# Altium footprint library ICs And Semiconductors THD.PcbLib: 507 footprints (part 18 of 32) (continued)
## LED_DIALIGHT_571-0122-100F [mm] "2x 2mm LED (Top: Green, Bot: Green) PCB Edge Mounting (With positioning pins) DIALIGHT 571 Serie"
height 8.6
pads (4):
  round 1.7 hole 1: 1(0,0) 2(2.54,0) 3(5.08,0) 4(7.62,0)
Top Overlay:
  lines w0.2: -5.029,-0.902 -5.652,-0.902 cw(c-5.652,0) -5.652,0.902 -5.029,0.902 ; -4.826,-1.191 -5.029,-1.191 -5.029,1.196 -4.826,1.196 ; -4.445,0 -4.064,0 ; -4.064,-0.508 -4.064,0.508 ; -3.556,0 -3.175,0 ; -2.794,0 -2.413,0 ; -2.413,-0.508 -2.413,0.508 ; -1.905,0 -1.524,0 ; -1.67,-1.245 -1.67,-2.22 ccw(c-1.37,-2.22) -1.37,-2.52 -1.17,-2.52 ccw(c-1.17,-2.22) -1.15,-2.519 ; -0.87,-1.788 -0.87,-1.245 ; 3.41,-1.788 3.41,-1.245 ; 3.69,-2.519 ccw(c3.71,-2.22) 3.71,-2.52 3.91,-2.52 ccw(c3.91,-2.22) 3.93,-2.519 ; 4.21,-1.788 4.21,-1.245 ; -4.064,0 -3.556,0.508 -3.556,-0.508 -4.064,0 ; -2.413,0 -1.905,0.508 -1.905,-0.508 -2.413,0 ; -4.826,-1.245 -4.826,1.245 8.89,1.245 8.89,-1.245 -4.826,-1.245
Notvisible:
  lines w0.1: -1,0 0,0 ; 0,-1 0,0 ; 0,1 0,0 ; 1,0 0,0 ; 1.54,0 2.54,0 ; 2.54,-1 2.54,0 ; 2.54,1 2.54,0 ; 3.54,0 2.54,0 ; 4.08,0 5.08,0 ; 5.08,-1 5.08,0 ; 5.08,1 5.08,0 ; 6.08,0 5.08,0 ; 6.62,0 7.62,0 ; 7.62,-1 7.62,0 ; 7.62,1 7.62,0 ; 8.62,0 7.62,0
Mechanical 14:
  lines w0.1: -5.029,-0.902 -5.652,-0.902 cw(c-5.652,0) -5.652,0.902 -5.029,0.902 ; -4.826,-1.191 -5.029,-1.191 -5.029,1.196 -4.826,1.196 ; -4.445,0 -4.064,0 ; -3.556,0 -3.175,0 ; -2.794,0 -2.413,0 ; -1.905,0 -1.524,0 ; -1.67,-1.245 -1.67,-2.22 ccw(c-1.37,-2.22) -1.37,-2.52 -1.17,-2.52 ccw(c-1.17,-2.22) -0.87,-2.22 -0.87,-1.245 ; 3.41,-1.245 3.41,-2.22 ccw(c3.71,-2.22) 3.71,-2.52 3.91,-2.52 ccw(c3.91,-2.22) 4.21,-2.22 4.21,-1.245 ; -4.064,-0.508 -4.064,0.508 ; -4.064,-0.508 -4.064,0.508 ; -4.064,-0.508 -4.064,0.508 ; -4.064,0 -3.556,-0.508 ; -4.064,0 -3.556,0.508 ; -4.064,0 -3.556,0.508 ; -4.064,0 -3.556,-0.508 ; -4.064,0 -3.556,-0.508 ; -4.064,0 -3.556,0.508 ; -3.556,-0.508 -3.556,0.508 ; -3.556,-0.508 -3.556,0.508 ; -3.556,-0.508 -3.556,0.508 ; -2.413,-0.508 -2.413,0.508 ; -2.413,-0.508 -2.413,0.508 ; -2.413,-0.508 -2.413,0.508 ; -2.413,0 -1.905,-0.508 ; -2.413,0 -1.905,0.508 ; -2.413,0 -1.905,0.508 ; -2.413,0 -1.905,-0.508 ; -2.413,0 -1.905,-0.508 ; -2.413,0 -1.905,0.508 ; -1.905,-0.508 -1.905,0.508 ; -1.905,-0.508 -1.905,0.508 ; -1.905,-0.508 -1.905,0.508 ; -4.826,-1.245 -4.826,1.245 8.89,1.245 8.89,-1.245 -4.826,-1.245
3D body "LED_DIALIGHT_571-0122-100F.stp": height 8.61, standoff -3, extent -6.553,-2.52 8.89,1.245

## LED_DIALIGHT_571-0122F [mm] "2x 2mm LED (Top: Green, Bot: Green) PCB Edge Mounting (Without positioning pins) DIALIGHT 571 Serie"
height 8.6
pads (4):
  round 1.7 hole 1: 1(0,0) 2(2.54,0) 3(5.08,0) 4(7.62,0)
Top Overlay:
  lines w0.2: -5.029,-0.902 -5.652,-0.902 cw(c-5.652,0) -5.652,0.902 -5.029,0.902 ; -4.826,-1.191 -5.029,-1.191 -5.029,1.196 -4.826,1.196 ; -4.445,0 -4.064,0 ; -4.064,-0.508 -4.064,0.508 ; -3.556,0 -3.175,0 ; -2.794,0 -2.413,0 ; -2.413,-0.508 -2.413,0.508 ; -1.905,0 -1.524,0 ; -4.064,0 -3.556,-0.508 -3.556,0.508 -4.064,0 ; -2.413,0 -1.905,-0.508 -1.905,0.508 -2.413,0 ; -4.826,-1.245 -4.826,1.245 8.89,1.245 8.89,-1.245 -4.826,-1.245
Notvisible:
  lines w0.1: -1,0 0,0 ; 0,-1 0,0 ; 0,1 0,0 ; 1,0 0,0 ; 1.54,0 2.54,0 ; 2.54,-1 2.54,0 ; 2.54,1 2.54,0 ; 3.54,0 2.54,0 ; 4.08,0 5.08,0 ; 5.08,-1 5.08,0 ; 5.08,1 5.08,0 ; 6.08,0 5.08,0 ; 6.62,0 7.62,0 ; 7.62,-1 7.62,0 ; 7.62,1 7.62,0 ; 8.62,0 7.62,0
Mechanical 14:
  lines w0.1: -5.029,-0.902 -5.652,-0.902 cw(c-5.652,0) -5.652,0.902 -5.029,0.902 ; -4.826,-1.191 -5.029,-1.191 -5.029,1.196 -4.826,1.196 ; -4.445,0 -4.064,0 ; -3.556,0 -3.175,0 ; -2.794,0 -2.413,0 ; -1.905,0 -1.524,0 ; -4.064,-0.508 -4.064,0.508 ; -4.064,-0.508 -4.064,0.508 ; -4.064,-0.508 -4.064,0.508 ; -4.064,0 -3.556,0.508 ; -4.064,0 -3.556,-0.508 ; -4.064,0 -3.556,-0.508 ; -4.064,0 -3.556,0.508 ; -4.064,0 -3.556,0.508 ; -4.064,0 -3.556,-0.508 ; -3.556,-0.508 -3.556,0.508 ; -3.556,-0.508 -3.556,0.508 ; -3.556,-0.508 -3.556,0.508 ; -2.413,-0.508 -2.413,0.508 ; -2.413,-0.508 -2.413,0.508 ; -2.413,-0.508 -2.413,0.508 ; -2.413,0 -1.905,0.508 ; -2.413,0 -1.905,-0.508 ; -2.413,0 -1.905,-0.508 ; -2.413,0 -1.905,0.508 ; -2.413,0 -1.905,0.508 ; -2.413,0 -1.905,-0.508 ; -1.905,-0.508 -1.905,0.508 ; -1.905,-0.508 -1.905,0.508 ; -1.905,-0.508 -1.905,0.508 ; -4.826,-1.245 -4.826,1.245 8.89,1.245 8.89,-1.245 -4.826,-1.245
3D body "LED_DIALIGHT_571-0122F.stp": height 8.61, standoff -3, extent -6.553,-1.244 8.89,1.245

## LED_DIALIGHT_571-0123-100F [mm] "2x 2mm LED (Top: Green, Bot: Yellow) PCB Edge Mounting (With positioning pins) DIALIGHT 571 Serie"
height 8.6
pads (4):
  round 1.7 hole 1: 1(0,0) 2(2.54,0) 3(5.08,0) 4(7.62,0)
Top Overlay:
  lines w0.2: -5.029,-0.902 -5.652,-0.902 cw(c-5.652,0) -5.652,0.902 -5.029,0.902 ; -4.826,-1.191 -5.029,-1.191 -5.029,1.196 -4.826,1.196 ; -4.445,0 -4.064,0 ; -4.064,-0.508 -4.064,0.508 ; -3.556,0 -3.175,0 ; -2.794,0 -2.413,0 ; -2.413,-0.508 -2.413,0.508 ; -1.905,0 -1.524,0 ; -1.67,-1.245 -1.67,-2.22 ccw(c-1.37,-2.22) -1.37,-2.52 -1.17,-2.52 ccw(c-1.17,-2.22) -1.15,-2.519 ; -0.87,-1.788 -0.87,-1.245 ; 3.41,-1.788 3.41,-1.245 ; 3.69,-2.519 ccw(c3.71,-2.22) 3.71,-2.52 3.91,-2.52 ccw(c3.91,-2.22) 3.93,-2.519 ; 4.21,-1.788 4.21,-1.245 ; -4.064,0 -3.556,-0.508 -3.556,0.508 -4.064,0 ; -2.413,0 -1.905,-0.508 -1.905,0.508 -2.413,0 ; -4.826,-1.245 8.89,-1.245 8.89,1.245 -4.826,1.245 -4.826,-1.245
Notvisible:
  lines w0.1: -1,0 0,0 ; 0,-1 0,0 ; 0,1 0,0 ; 1,0 0,0 ; 1.54,0 2.54,0 ; 2.54,-1 2.54,0 ; 2.54,1 2.54,0 ; 3.54,0 2.54,0 ; 4.08,0 5.08,0 ; 5.08,-1 5.08,0 ; 5.08,1 5.08,0 ; 6.08,0 5.08,0 ; 6.62,0 7.62,0 ; 7.62,-1 7.62,0 ; 7.62,1 7.62,0 ; 8.62,0 7.62,0
Mechanical 14:
  lines w0.1: -5.029,-0.902 -5.652,-0.902 cw(c-5.652,0) -5.652,0.902 -5.029,0.902 ; -4.826,-1.191 -5.029,-1.191 -5.029,1.196 -4.826,1.196 ; -4.445,0 -4.064,0 ; -3.556,0 -3.175,0 ; -2.794,0 -2.413,0 ; -1.905,0 -1.524,0 ; -1.67,-1.245 -1.67,-2.22 ccw(c-1.37,-2.22) -1.37,-2.52 -1.17,-2.52 ccw(c-1.17,-2.22) -0.87,-2.22 -0.87,-1.245 ; 3.41,-1.245 3.41,-2.22 ccw(c3.71,-2.22) 3.71,-2.52 3.91,-2.52 ccw(c3.91,-2.22) 4.21,-2.22 4.21,-1.245 ; -4.064,-0.508 -4.064,0.508 ; -4.064,-0.508 -4.064,0.508 ; -4.064,-0.508 -4.064,0.508 ; -4.064,0 -3.556,0.508 ; -4.064,0 -3.556,-0.508 ; -4.064,0 -3.556,-0.508 ; -4.064,0 -3.556,0.508 ; -4.064,0 -3.556,0.508 ; -4.064,0 -3.556,-0.508 ; -3.556,-0.508 -3.556,0.508 ; -3.556,-0.508 -3.556,0.508 ; -3.556,-0.508 -3.556,0.508 ; -2.413,-0.508 -2.413,0.508 ; -2.413,-0.508 -2.413,0.508 ; -2.413,-0.508 -2.413,0.508 ; -2.413,0 -1.905,0.508 ; -2.413,0 -1.905,-0.508 ; -2.413,0 -1.905,-0.508 ; -2.413,0 -1.905,0.508 ; -2.413,0 -1.905,0.508 ; -2.413,0 -1.905,-0.508 ; -1.905,-0.508 -1.905,0.508 ; -1.905,-0.508 -1.905,0.508 ; -1.905,-0.508 -1.905,0.508 ; -4.826,-1.245 8.89,-1.245 8.89,1.245 -4.826,1.245 -4.826,-1.245
3D body "LED_DIALIGHT_571-0123-100F.stp": height 8.61, standoff -3, extent -6.553,-2.52 8.89,1.245

## LED_DIALIGHT_571-0123F [mm] "2x 2mm LED (Top: Green, Bot: Yellow) PCB Edge Mounting (Without positioning pins) DIALIGHT 571 Serie"
height 8.6
pads (4):
  round 1.7 hole 1: 1(0,0) 2(2.54,0) 3(5.08,0) 4(7.62,0)
Top Overlay:
  lines w0.2: -5.029,-0.902 -5.652,-0.902 cw(c-5.652,0) -5.652,0.902 -5.029,0.902 ; -4.826,-1.191 -5.029,-1.191 -5.029,1.196 -4.826,1.196 ; -4.445,0 -4.064,0 ; -4.064,-0.508 -4.064,0.508 ; -3.556,0 -3.175,0 ; -2.794,0 -2.413,0 ; -2.413,-0.508 -2.413,0.508 ; -1.905,0 -1.524,0 ; -4.064,0 -3.556,-0.508 -3.556,0.508 -4.064,0 ; -2.413,0 -1.905,-0.508 -1.905,0.508 -2.413,0 ; -4.826,-1.245 -4.826,1.245 8.89,1.245 8.89,-1.245 -4.826,-1.245
Notvisible:
  lines w0.1: -1,0 0,0 ; -0.5,0 0,0 ; 0,-1 0,0 ; 0,-0.5 0,0 ; 0,0.5 0,0 ; 0,1 0,0 ; 0.5,0 0,0 ; 1,0 0,0 ; 1.54,0 2.54,0 ; 2.04,0 2.54,0 ; 2.54,-1 2.54,0 ; 2.54,-0.5 2.54,0 ; 2.54,0.5 2.54,0 ; 2.54,1 2.54,0 ; 3.04,0 2.54,0 ; 3.54,0 2.54,0 ; 4.08,0 5.08,0 ; 4.58,0 5.08,0 ; 5.08,-1 5.08,0 ; 5.08,-0.5 5.08,0 ; 5.08,0.5 5.08,0 ; 5.08,1 5.08,0 ; 5.58,0 5.08,0 ; 6.08,0 5.08,0 ; 6.62,0 7.62,0 ; 7.12,0 7.62,0 ; 7.62,-1 7.62,0 ; 7.62,-0.5 7.62,0 ; 7.62,0.5 7.62,0 ; 7.62,1 7.62,0 ; 8.12,0 7.62,0 ; 8.62,0 7.62,0
Mechanical 14:
  lines w0.1: -5.029,-0.902 -5.652,-0.902 cw(c-5.652,0) -5.652,0.902 -5.029,0.902 ; -4.826,-1.191 -5.029,-1.191 -5.029,1.196 -4.826,1.196 ; -4.445,0 -4.064,0 ; -3.556,0 -3.175,0 ; -2.794,0 -2.413,0 ; -1.905,0 -1.524,0 ; -4.064,-0.508 -4.064,0.508 ; -4.064,-0.508 -4.064,0.508 ; -4.064,-0.508 -4.064,0.508 ; -4.064,0 -3.556,0.508 ; -4.064,0 -3.556,-0.508 ; -4.064,0 -3.556,-0.508 ; -4.064,0 -3.556,0.508 ; -4.064,0 -3.556,0.508 ; -4.064,0 -3.556,-0.508 ; -3.556,-0.508 -3.556,0.508 ; -3.556,-0.508 -3.556,0.508 ; -3.556,-0.508 -3.556,0.508 ; -2.413,-0.508 -2.413,0.508 ; -2.413,-0.508 -2.413,0.508 ; -2.413,-0.508 -2.413,0.508 ; -2.413,0 -1.905,0.508 ; -2.413,0 -1.905,-0.508 ; -2.413,0 -1.905,-0.508 ; -2.413,0 -1.905,0.508 ; -2.413,0 -1.905,0.508 ; -2.413,0 -1.905,-0.508 ; -1.905,-0.508 -1.905,0.508 ; -1.905,-0.508 -1.905,0.508 ; -1.905,-0.508 -1.905,0.508 ; -4.826,-1.245 -4.826,1.245 8.89,1.245 8.89,-1.245 -4.826,-1.245
3D body "LED_DIALIGHT_571-0123F.stp": height 8.61, standoff -3, extent -6.553,-1.244 8.89,1.245

## LED_DIALIGHT_571-0132-100F [mm] "2x 2mm LED (Top: Yellow, Bot: Green) PCB Edge Mounting (With positioning pins) DIALIGHT 571 Serie"
height 8.6
pads (4):
  round 1.7 hole 1: 1(0,0) 2(2.54,0) 3(5.08,0) 4(7.62,0)
Top Overlay:
  lines w0.2: -5.029,-0.902 -5.652,-0.902 cw(c-5.652,0) -5.652,0.902 -5.029,0.902 ; -4.826,-1.191 -5.029,-1.191 -5.029,1.196 -4.826,1.196 ; -4.445,0 -4.064,0 ; -4.064,-0.508 -4.064,0.508 ; -3.556,0 -3.175,0 ; -2.794,0 -2.413,0 ; -2.413,-0.508 -2.413,0.508 ; -1.905,0 -1.524,0 ; -1.67,-1.245 -1.67,-2.22 ccw(c-1.37,-2.22) -1.37,-2.52 -1.17,-2.52 ccw(c-1.17,-2.22) -1.15,-2.519 ; -0.87,-1.788 -0.87,-1.245 ; 3.41,-1.788 3.41,-1.245 ; 3.69,-2.519 ccw(c3.71,-2.22) 3.71,-2.52 3.91,-2.52 ccw(c3.91,-2.22) 3.93,-2.519 ; 4.21,-1.788 4.21,-1.245 ; -4.064,0 -3.556,-0.508 -3.556,0.508 -4.064,0 ; -2.413,0 -1.905,-0.508 -1.905,0.508 -2.413,0 ; -4.826,-1.245 8.89,-1.245 8.89,1.245 -4.826,1.245 -4.826,-1.245
Notvisible:
  lines w0.1: -1,0 0,0 ; 0,-1 0,0 ; 0,1 0,0 ; 1,0 0,0 ; 1.54,0 2.54,0 ; 2.54,-1 2.54,0 ; 2.54,1 2.54,0 ; 3.54,0 2.54,0 ; 4.08,0 5.08,0 ; 5.08,-1 5.08,0 ; 5.08,1 5.08,0 ; 6.08,0 5.08,0 ; 6.62,0 7.62,0 ; 7.62,-1 7.62,0 ; 7.62,1 7.62,0 ; 8.62,0 7.62,0
Mechanical 14:
  lines w0.1: -5.029,-0.902 -5.652,-0.902 cw(c-5.652,0) -5.652,0.902 -5.029,0.902 ; -4.826,-1.191 -5.029,-1.191 -5.029,1.196 -4.826,1.196 ; -4.445,0 -4.064,0 ; -3.556,0 -3.175,0 ; -2.794,0 -2.413,0 ; -1.905,0 -1.524,0 ; -1.67,-1.245 -1.67,-2.22 ccw(c-1.37,-2.22) -1.37,-2.52 -1.17,-2.52 ccw(c-1.17,-2.22) -0.87,-2.22 -0.87,-1.245 ; 3.41,-1.245 3.41,-2.22 ccw(c3.71,-2.22) 3.71,-2.52 3.91,-2.52 ccw(c3.91,-2.22) 4.21,-2.22 4.21,-1.245 ; -4.064,-0.508 -4.064,0.508 ; -4.064,-0.508 -4.064,0.508 ; -4.064,-0.508 -4.064,0.508 ; -4.064,0 -3.556,0.508 ; -4.064,0 -3.556,-0.508 ; -4.064,0 -3.556,-0.508 ; -4.064,0 -3.556,0.508 ; -4.064,0 -3.556,0.508 ; -4.064,0 -3.556,-0.508 ; -3.556,-0.508 -3.556,0.508 ; -3.556,-0.508 -3.556,0.508 ; -3.556,-0.508 -3.556,0.508 ; -2.413,-0.508 -2.413,0.508 ; -2.413,-0.508 -2.413,0.508 ; -2.413,-0.508 -2.413,0.508 ; -2.413,0 -1.905,0.508 ; -2.413,0 -1.905,-0.508 ; -2.413,0 -1.905,-0.508 ; -2.413,0 -1.905,0.508 ; -2.413,0 -1.905,0.508 ; -2.413,0 -1.905,-0.508 ; -1.905,-0.508 -1.905,0.508 ; -1.905,-0.508 -1.905,0.508 ; -1.905,-0.508 -1.905,0.508 ; -4.826,-1.245 8.89,-1.245 8.89,1.245 -4.826,1.245 -4.826,-1.245
3D body "LED_DIALIGHT_571-0132-100F.stp": height 8.61, standoff -3, extent -6.553,-2.52 8.89,1.245

## LED_DIALIGHT_571-0132F [mm] "2x 2mm LED (Top: Yellow, Bot: Green) PCB Edge Mounting (Without positioning pins) DIALIGHT 571 Serie"
height 8.6
pads (4):
  round 1.7 hole 1: 1(0,0) 2(2.54,0) 3(5.08,0) 4(7.62,0)
Top Overlay:
  lines w0.2: -5.029,-0.902 -5.652,-0.902 cw(c-5.652,0) -5.652,0.902 -5.029,0.902 ; -4.826,-1.191 -5.029,-1.191 -5.029,1.196 -4.826,1.196 ; -4.445,0 -4.064,0 ; -4.064,-0.508 -4.064,0.508 ; -3.556,0 -3.175,0 ; -2.794,0 -2.413,0 ; -2.413,-0.508 -2.413,0.508 ; -1.905,0 -1.524,0 ; -4.064,0 -3.556,-0.508 -3.556,0.508 -4.064,0 ; -2.413,0 -1.905,-0.508 -1.905,0.508 -2.413,0 ; -4.826,-1.245 8.89,-1.245 8.89,1.245 -4.826,1.245 -4.826,-1.245
Notvisible:
  lines w0.1: -1,0 0,0 ; -0.5,0 0,0 ; 0,-1 0,0 ; 0,-0.5 0,0 ; 0,0.5 0,0 ; 0,1 0,0 ; 0.5,0 0,0 ; 1,0 0,0 ; 1.54,0 2.54,0 ; 2.04,0 2.54,0 ; 2.54,-1 2.54,0 ; 2.54,-0.5 2.54,0 ; 2.54,0.5 2.54,0 ; 2.54,1 2.54,0 ; 3.04,0 2.54,0 ; 3.54,0 2.54,0 ; 4.08,0 5.08,0 ; 4.58,0 5.08,0 ; 5.08,-1 5.08,0 ; 5.08,-0.5 5.08,0 ; 5.08,0.5 5.08,0 ; 5.08,1 5.08,0 ; 5.58,0 5.08,0 ; 6.08,0 5.08,0 ; 6.62,0 7.62,0 ; 7.12,0 7.62,0 ; 7.62,-1 7.62,0 ; 7.62,-0.5 7.62,0 ; 7.62,0.5 7.62,0 ; 7.62,1 7.62,0 ; 8.12,0 7.62,0 ; 8.62,0 7.62,0
Mechanical 14:
  lines w0.1: -5.029,-0.902 -5.652,-0.902 cw(c-5.652,0) -5.652,0.902 -5.029,0.902 ; -4.826,-1.191 -5.029,-1.191 -5.029,1.196 -4.826,1.196 ; -4.445,0 -4.064,0 ; -3.556,0 -3.175,0 ; -2.794,0 -2.413,0 ; -1.905,0 -1.524,0 ; -4.064,-0.508 -4.064,0.508 ; -4.064,-0.508 -4.064,0.508 ; -4.064,-0.508 -4.064,0.508 ; -4.064,0 -3.556,0.508 ; -4.064,0 -3.556,-0.508 ; -4.064,0 -3.556,-0.508 ; -4.064,0 -3.556,0.508 ; -4.064,0 -3.556,0.508 ; -4.064,0 -3.556,-0.508 ; -3.556,-0.508 -3.556,0.508 ; -3.556,-0.508 -3.556,0.508 ; -3.556,-0.508 -3.556,0.508 ; -2.413,-0.508 -2.413,0.508 ; -2.413,-0.508 -2.413,0.508 ; -2.413,-0.508 -2.413,0.508 ; -2.413,0 -1.905,0.508 ; -2.413,0 -1.905,-0.508 ; -2.413,0 -1.905,-0.508 ; -2.413,0 -1.905,0.508 ; -2.413,0 -1.905,0.508 ; -2.413,0 -1.905,-0.508 ; -1.905,-0.508 -1.905,0.508 ; -1.905,-0.508 -1.905,0.508 ; -1.905,-0.508 -1.905,0.508 ; -4.826,-1.245 8.89,-1.245 8.89,1.245 -4.826,1.245 -4.826,-1.245
3D body "LED_DIALIGHT_571-0132F.stp": height 8.61, standoff -3, extent -6.553,-1.244 8.89,1.245

## LED_DIALIGHT_571-0133-100F [mm] "2x 2mm LED (Top: Yellow, Bot: Yellow) PCB Edge Mounting (With positioning pins) DIALIGHT 571 Serie"
height 8.6
pads (4):
  round 1.7 hole 1: 1(0,0) 2(2.54,0) 3(5.08,0) 4(7.62,0)
Top Overlay:
  lines w0.2: -5.029,-0.902 -5.652,-0.902 cw(c-5.652,0) -5.652,0.902 -5.029,0.902 ; -4.826,-1.191 -5.029,-1.191 -5.029,1.196 -4.826,1.196 ; -4.445,0 -4.064,0 ; -4.064,-0.508 -4.064,0.508 ; -3.556,0 -3.175,0 ; -2.794,0 -2.413,0 ; -2.413,-0.508 -2.413,0.508 ; -1.905,0 -1.524,0 ; -1.67,-1.245 -1.67,-2.22 ccw(c-1.37,-2.22) -1.37,-2.52 -1.17,-2.52 ccw(c-1.17,-2.22) -1.15,-2.519 ; -0.87,-1.788 -0.87,-1.245 ; 3.41,-1.788 3.41,-1.245 ; 3.69,-2.519 ccw(c3.71,-2.22) 3.71,-2.52 3.91,-2.52 ccw(c3.91,-2.22) 3.93,-2.519 ; 4.21,-1.788 4.21,-1.245 ; -4.064,0 -3.556,0.508 -3.556,-0.508 -4.064,0 ; -2.413,0 -1.905,0.508 -1.905,-0.508 -2.413,0 ; -4.826,-1.245 -4.826,1.245 8.89,1.245 8.89,-1.245 -4.826,-1.245
Notvisible:
  lines w0.1: -1,0 0,0 ; 0,-1 0,0 ; 0,1 0,0 ; 1,0 0,0 ; 1.54,0 2.54,0 ; 2.54,-1 2.54,0 ; 2.54,1 2.54,0 ; 3.54,0 2.54,0 ; 4.08,0 5.08,0 ; 5.08,-1 5.08,0 ; 5.08,1 5.08,0 ; 6.08,0 5.08,0 ; 6.62,0 7.62,0 ; 7.62,-1 7.62,0 ; 7.62,1 7.62,0 ; 8.62,0 7.62,0
Mechanical 14:
  lines w0.1: -5.029,-0.902 -5.652,-0.902 cw(c-5.652,0) -5.652,0.902 -5.029,0.902 ; -4.826,-1.191 -5.029,-1.191 -5.029,1.196 -4.826,1.196 ; -4.445,0 -4.064,0 ; -3.556,0 -3.175,0 ; -2.794,0 -2.413,0 ; -1.905,0 -1.524,0 ; -1.67,-1.245 -1.67,-2.22 ccw(c-1.37,-2.22) -1.37,-2.52 -1.17,-2.52 ccw(c-1.17,-2.22) -0.87,-2.22 -0.87,-1.245 ; 3.41,-1.245 3.41,-2.22 ccw(c3.71,-2.22) 3.71,-2.52 3.91,-2.52 ccw(c3.91,-2.22) 4.21,-2.22 4.21,-1.245 ; -4.064,-0.508 -4.064,0.508 ; -4.064,-0.508 -4.064,0.508 ; -4.064,-0.508 -4.064,0.508 ; -4.064,0 -3.556,-0.508 ; -4.064,0 -3.556,0.508 ; -4.064,0 -3.556,0.508 ; -4.064,0 -3.556,-0.508 ; -4.064,0 -3.556,-0.508 ; -4.064,0 -3.556,0.508 ; -3.556,-0.508 -3.556,0.508 ; -3.556,-0.508 -3.556,0.508 ; -3.556,-0.508 -3.556,0.508 ; -2.413,-0.508 -2.413,0.508 ; -2.413,-0.508 -2.413,0.508 ; -2.413,-0.508 -2.413,0.508 ; -2.413,0 -1.905,-0.508 ; -2.413,0 -1.905,0.508 ; -2.413,0 -1.905,0.508 ; -2.413,0 -1.905,-0.508 ; -2.413,0 -1.905,-0.508 ; -2.413,0 -1.905,0.508 ; -1.905,-0.508 -1.905,0.508 ; -1.905,-0.508 -1.905,0.508 ; -1.905,-0.508 -1.905,0.508 ; -4.826,-1.245 -4.826,1.245 8.89,1.245 8.89,-1.245 -4.826,-1.245
3D body "LED_DIALIGHT_571-0133-100F.stp": height 8.61, standoff -3, extent -6.553,-2.52 8.89,1.245

## LED_DIALIGHT_571-0133F [mm] "2x 2mm LED (Top: Yellow, Bot: Yellow) PCB Edge Mounting (Without positioning pins) DIALIGHT 571 Serie"
height 8.6
pads (4):
  round 1.7 hole 1: 1(0,0) 2(2.54,0) 3(5.08,0) 4(7.62,0)
Top Overlay:
  lines w0.2: -5.029,-0.902 -5.652,-0.902 cw(c-5.652,0) -5.652,0.902 -5.029,0.902 ; -4.826,-1.191 -5.029,-1.191 -5.029,1.196 -4.826,1.196 ; -4.064,0 -4.445,0 -4.064,0 ; -4.064,0 -3.556,0.508 ; -4.064,0 -3.556,-0.508 ; -4.064,0 -3.556,0.508 ; -4.064,0 -3.556,-0.508 ; -3.556,-0.508 -3.556,0.508 ; -3.556,-0.508 -3.556,0.508 ; -2.413,0 -2.794,0 -2.413,0 ; -2.413,0 -1.905,0.508 ; -2.413,0 -1.905,-0.508 ; -2.413,0 -1.905,0.508 ; -2.413,0 -1.905,-0.508 ; -1.905,-0.508 -1.905,0.508 ; -1.905,-0.508 -1.905,0.508 ; -4.826,-1.245 -4.826,1.245 8.89,1.245 8.89,-1.245 -4.826,-1.245 ; -4.064,-0.508 -4.064,0.508 -4.064,-0.508 ; -3.556,0 -3.175,0 -3.556,0 ; -2.413,-0.508 -2.413,0.508 -2.413,-0.508 ; -1.905,0 -1.524,0 -1.905,0
Notvisible:
  lines w0.1: -1,0 0,0 ; 0,-1 0,0 ; 0,1 0,0 ; 1,0 0,0 ; 1.54,0 2.54,0 ; 2.54,-1 2.54,0 ; 2.54,1 2.54,0 ; 3.54,0 2.54,0 ; 4.08,0 5.08,0 ; 5.08,-1 5.08,0 ; 5.08,1 5.08,0 ; 6.08,0 5.08,0 ; 6.62,0 7.62,0 ; 7.62,-1 7.62,0 ; 7.62,1 7.62,0 ; 8.62,0 7.62,0
Mechanical 14:
  lines w0.1: -4.445,0 -4.064,0 ; -3.556,0 -3.175,0 ; -2.794,0 -2.413,0 ; -1.905,0 -1.524,0 ; -4.064,-0.508 -4.064,0.508 ; -4.064,-0.508 -4.064,0.508 ; -4.064,-0.508 -4.064,0.508 ; -4.064,0 -3.556,-0.508 ; -4.064,0 -3.556,0.508 ; -4.064,0 -3.556,0.508 ; -4.064,0 -3.556,-0.508 ; -4.064,0 -3.556,-0.508 ; -4.064,0 -3.556,0.508 ; -3.556,-0.508 -3.556,0.508 ; -3.556,-0.508 -3.556,0.508 ; -3.556,-0.508 -3.556,0.508 ; -2.413,-0.508 -2.413,0.508 ; -2.413,-0.508 -2.413,0.508 ; -2.413,-0.508 -2.413,0.508 ; -2.413,0 -1.905,-0.508 ; -2.413,0 -1.905,0.508 ; -2.413,0 -1.905,0.508 ; -2.413,0 -1.905,-0.508 ; -2.413,0 -1.905,-0.508 ; -2.413,0 -1.905,0.508 ; -1.905,-0.508 -1.905,0.508 ; -1.905,-0.508 -1.905,0.508 ; -1.905,-0.508 -1.905,0.508
3D body "LED_DIALIGHT_571-0133F.stp": height 8.61, standoff -3, extent -6.553,-1.244 8.89,1.245

## LED_FORGE-EU_FCL-P5DR078G03B12WCCI [mm] "7.6mm Square Domed Tricolor (RGB) Through Hole LED Lamp"
height 7.4
pads (4):
  round 1.9 hole 1.2: 1(2.54,-2.54) 2(-2.54,-2.54) 3(-2.54,2.54) 4(2.54,2.54)
Top Layer keep-out:
  region: -1.475,-1.975 1.475,-1.975 1.475,-3.225 -1.475,-3.225
Top Overlay:
  circle w0.2: c0,0 r2.2
  lines w0.2: -3.81,-3.09 -3.09,-3.81 3.81,-3.81 3.81,3.81 -3.81,3.81 -3.81,-3.09 ; -0.8,-0.8 -0.8,-0.2 -0.2,-0.2 -0.2,-0.8 -0.8,-0.8 ; -0.8,0.2 -0.8,0.8 -0.2,0.8 -0.2,0.2 -0.8,0.2 ; 0.2,-0.3 0.2,0.3 0.8,0.3 0.8,-0.3 0.2,-0.3
Notvisible:
  lines w0.1: -3.04,-2.54 -2.54,-2.54 ; -3.04,2.54 -2.54,2.54 ; -2.54,-3.04 -2.54,-2.54 ; -2.54,-2.04 -2.54,-2.54 ; -2.54,2.04 -2.54,2.54 ; -2.54,3.04 -2.54,2.54 ; -2.04,-2.54 -2.54,-2.54 ; -2.04,2.54 -2.54,2.54 ; -0.5,0 0,0 ; 0,-0.5 0,0 ; 0,0.5 0,0 ; 0.5,0 0,0 ; 2.04,-2.54 2.54,-2.54 ; 2.04,2.54 2.54,2.54 ; 2.54,-3.04 2.54,-2.54 ; 2.54,-2.04 2.54,-2.54 ; 2.54,2.04 2.54,2.54 ; 2.54,3.04 2.54,2.54 ; 3.04,-2.54 2.54,-2.54 ; 3.04,2.54 2.54,2.54
Mechanical 14:
  circle w0.1: c0,0 r2.5
  lines w0.1: -3.81,-2.81 -2.81,-3.81 ; -3.81,-2.81 -3.81,3.81 ; -3.81,-2.81 -3.61,-2.727 ; -3.81,3.81 3.81,3.81 ; -3.81,3.81 -3.61,3.61 ; -3.61,-2.727 -2.727,-3.61 ; -3.61,-2.727 -3.61,3.61 ; -3.61,3.61 3.61,3.61 ; -2.81,-3.81 3.81,-3.81 ; -2.81,-3.81 -2.727,-3.61 ; -2.727,-3.61 3.61,-3.61 ; 3.61,-3.61 3.61,3.61 ; 3.61,-3.61 3.81,-3.81 ; 3.61,3.61 3.81,3.81 ; 3.81,-3.81 3.81,3.81 ; -0.8,-0.8 -0.8,-0.2 -0.2,-0.2 -0.2,-0.8 -0.8,-0.8 ; -0.8,0.2 -0.8,0.8 -0.2,0.8 -0.2,0.2 -0.8,0.2 ; 0.2,-0.3 0.2,0.3 0.8,0.3 0.8,-0.3 0.2,-0.3
3D body "LED_FORGE-EU_FCL-P5DR078G03B12WCCI.stp": height 7.4, standoff -3.6, extent -3.81,-3.81 3.81,3.81

## LED_KINGBRIGHT_DLC/6SRD [mm] "20mm Diameter Super Bright Red (GaAlAs) Big LED Lamp"
height 15.5
pads (12):
  round 1.5 hole 0.8: 1(-6.35,-7.62) 2(-3.81,-7.62) 3(-1.27,-7.62) 4(1.27,-7.62) 5(3.81,-7.62) 6(6.35,-7.62) 7(6.35,7.62) 8(3.81,7.62) 9(1.27,7.62) 10(-1.27,7.62) 11(-3.81,7.62) 12(-6.35,7.62)
Top Overlay:
  lines w0.2: -10.035,-1.35 -11.546,-1.35 ccw(c0,0) 11.546,-1.35 10.035,-1.35 ; -10.035,1.35 -11.546,1.35 cw(c0,0) 11.546,1.35 10.035,1.35 ; -7.317,-6.998 cw(c0,0) -7.317,6.998 ; -6.35,-6.47 -6.35,-4.97 -5.58,-4.97 ; -6.35,6.47 -6.35,4.97 -5.58,4.97 ; -5.58,-5.97 -5.58,-3.97 ; -5.564,-8.459 ccw(c0,0) 5.564,-8.459 ; -5.564,8.459 cw(c0,0) 5.564,8.459 ; -4.58,-4.97 -3.81,-4.97 -3.81,-6.47 ; -4.58,3.97 -4.58,5.97 ; -3.81,6.47 -3.81,4.97 -4.58,4.97 ; -1.27,-6.47 -1.27,-4.97 -0.5,-4.97 ; -1.27,6.47 -1.27,4.97 -0.5,4.97 ; -0.5,-5.97 -0.5,-3.97 ; 0.5,-4.97 1.27,-4.97 1.27,-6.47 ; 0.5,3.97 0.5,5.97 ; 1.27,6.47 1.27,4.97 0.5,4.97 ; 3.81,-6.47 3.81,-4.97 4.58,-4.97 ; 3.81,6.47 3.81,4.97 4.58,4.97 ; 4.58,-5.97 4.58,-3.97 ; 5.58,-4.97 6.35,-4.97 6.35,-6.47 ; 5.58,3.97 5.58,5.97 ; 6.35,6.47 6.35,4.97 5.58,4.97 ; 7.317,-6.998 ccw(c0,0) 7.317,6.998 ; -5.58,-4.97 -4.58,-3.97 -4.58,-5.97 -5.58,-4.97 ; -4.58,4.97 -5.58,5.97 -5.58,3.97 -4.58,4.97 ; -0.5,-4.97 0.5,-3.97 0.5,-5.97 -0.5,-4.97 ; 0.5,4.97 -0.5,5.97 -0.5,3.97 0.5,4.97 ; 4.58,-4.97 5.58,-3.97 5.58,-5.97 4.58,-4.97 ; 5.58,4.97 4.58,5.97 4.58,3.97 5.58,4.97
Notvisible:
  lines w0.1: -6.85,-7.62 -6.35,-7.62 ; -6.85,7.62 -6.35,7.62 ; -6.35,-8.12 -6.35,-7.62 ; -6.35,-7.12 -6.35,-7.62 ; -6.35,7.12 -6.35,7.62 ; -6.35,8.12 -6.35,7.62 ; -5.85,-7.62 -6.35,-7.62 ; -5.85,7.62 -6.35,7.62 ; -4.31,-7.62 -3.81,-7.62 ; -4.31,7.62 -3.81,7.62 ; -3.81,-8.12 -3.81,-7.62 ; -3.81,-7.12 -3.81,-7.62 ; -3.81,7.12 -3.81,7.62 ; -3.81,8.12 -3.81,7.62 ; -3.31,-7.62 -3.81,-7.62 ; -3.31,7.62 -3.81,7.62 ; -1.77,-7.62 -1.27,-7.62 ; -1.77,7.62 -1.27,7.62 ; -1.27,-8.12 -1.27,-7.62 ; -1.27,-7.12 -1.27,-7.62 ; -1.27,7.12 -1.27,7.62 ; -1.27,8.12 -1.27,7.62 ; -0.77,-7.62 -1.27,-7.62 ; -0.77,7.62 -1.27,7.62 ; -0.5,0 0,0 ; 0,-0.5 0,0 ; 0,0.5 0,0 ; 0.5,0 0,0 ; 0.77,-7.62 1.27,-7.62 ; 0.77,7.62 1.27,7.62 ; 1.27,-8.12 1.27,-7.62 ; 1.27,-7.12 1.27,-7.62 ; 1.27,7.12 1.27,7.62 ; 1.27,8.12 1.27,7.62 ; 1.77,-7.62 1.27,-7.62 ; 1.77,7.62 1.27,7.62 ; 3.31,-7.62 3.81,-7.62 ; 3.31,7.62 3.81,7.62 ; 3.81,-8.12 3.81,-7.62 ; 3.81,-7.12 3.81,-7.62 ; 3.81,7.12 3.81,7.62 ; 3.81,8.12 3.81,7.62 ; 4.31,-7.62 3.81,-7.62 ; 4.31,7.62 3.81,7.62 ; 5.85,-7.62 6.35,-7.62 ; 5.85,7.62 6.35,7.62 ; 6.35,-8.12 6.35,-7.62 ; 6.35,-7.12 6.35,-7.62 ; 6.35,7.12 6.35,7.62 ; 6.35,8.12 6.35,7.62 ; 6.85,-7.62 6.35,-7.62 ; 6.85,7.62 6.35,7.62
  text "12" at -7.106,8.62 h1.2
  text "11" at -4.41,8.62 h1.2
  text "10" at -1.99,8.62 h1.2
  text "9" at 0.83,8.62 h1.2
  text "8" at 3.39,8.62 h1.2
  text "7" at 5.93,8.62 h1.2
  text "1" at -6.65,-9.82 h1.2
  text "2" at -4.251,-9.82 h1.2
  text "3" at -1.715,-9.82 h1.2
  text "4" at 0.79,-9.82 h1.2
  text "5" at 3.365,-9.82 h1.2
  text "6" at 5.936,-9.82 h1.2
Mechanical 14:
  circle w0.1: c0,0 r10.125
  lines w0.1: -10.035,-1.35 -11.546,-1.35 ccw(c0,0) 11.546,-1.35 10.035,-1.35 ; -10.035,1.35 -11.546,1.35 cw(c0,0) 11.546,1.35 10.035,1.35 ; -6.35,-6.47 -6.35,-4.97 -5.58,-4.97 ; -6.35,6.47 -6.35,4.97 -5.58,4.97 ; -5.58,-5.97 -5.58,-3.97 ; -4.58,-4.97 -3.81,-4.97 -3.81,-6.47 ; -4.58,3.97 -4.58,5.97 ; -3.81,6.47 -3.81,4.97 -4.58,4.97 ; -1.27,-6.47 -1.27,-4.97 -0.5,-4.97 ; -1.27,6.47 -1.27,4.97 -0.5,4.97 ; -0.5,-5.97 -0.5,-3.97 ; 0.5,-4.97 1.27,-4.97 1.27,-6.47 ; 0.5,3.97 0.5,5.97 ; 1.27,6.47 1.27,4.97 0.5,4.97 ; 3.81,-6.47 3.81,-4.97 4.58,-4.97 ; 3.81,6.47 3.81,4.97 4.58,4.97 ; 4.58,-5.97 4.58,-3.97 ; 5.58,-4.97 6.35,-4.97 6.35,-6.47 ; 5.58,3.97 5.58,5.97 ; 6.35,6.47 6.35,4.97 5.58,4.97 ; -5.58,-4.97 -4.58,-3.97 -4.58,-5.97 -5.58,-4.97 ; -4.58,4.97 -5.58,5.97 -5.58,3.97 -4.58,4.97 ; -0.5,-4.97 0.5,-3.97 0.5,-5.97 -0.5,-4.97 ; 0.5,4.97 -0.5,5.97 -0.5,3.97 0.5,4.97 ; 4.58,-4.97 5.58,-3.97 5.58,-5.97 4.58,-4.97 ; 5.58,4.97 4.58,5.97 4.58,3.97 5.58,4.97
3D body "LED_KINGBRIGHT_DLC-6SRD.stp": height 15.25, standoff -2.5, extent -11.546,-11.591 11.546,11.591